# Altium integrated library LEMO Unipole And Multipole Type Connectors.IntLib: 1566 symbols (part 8 of 13)
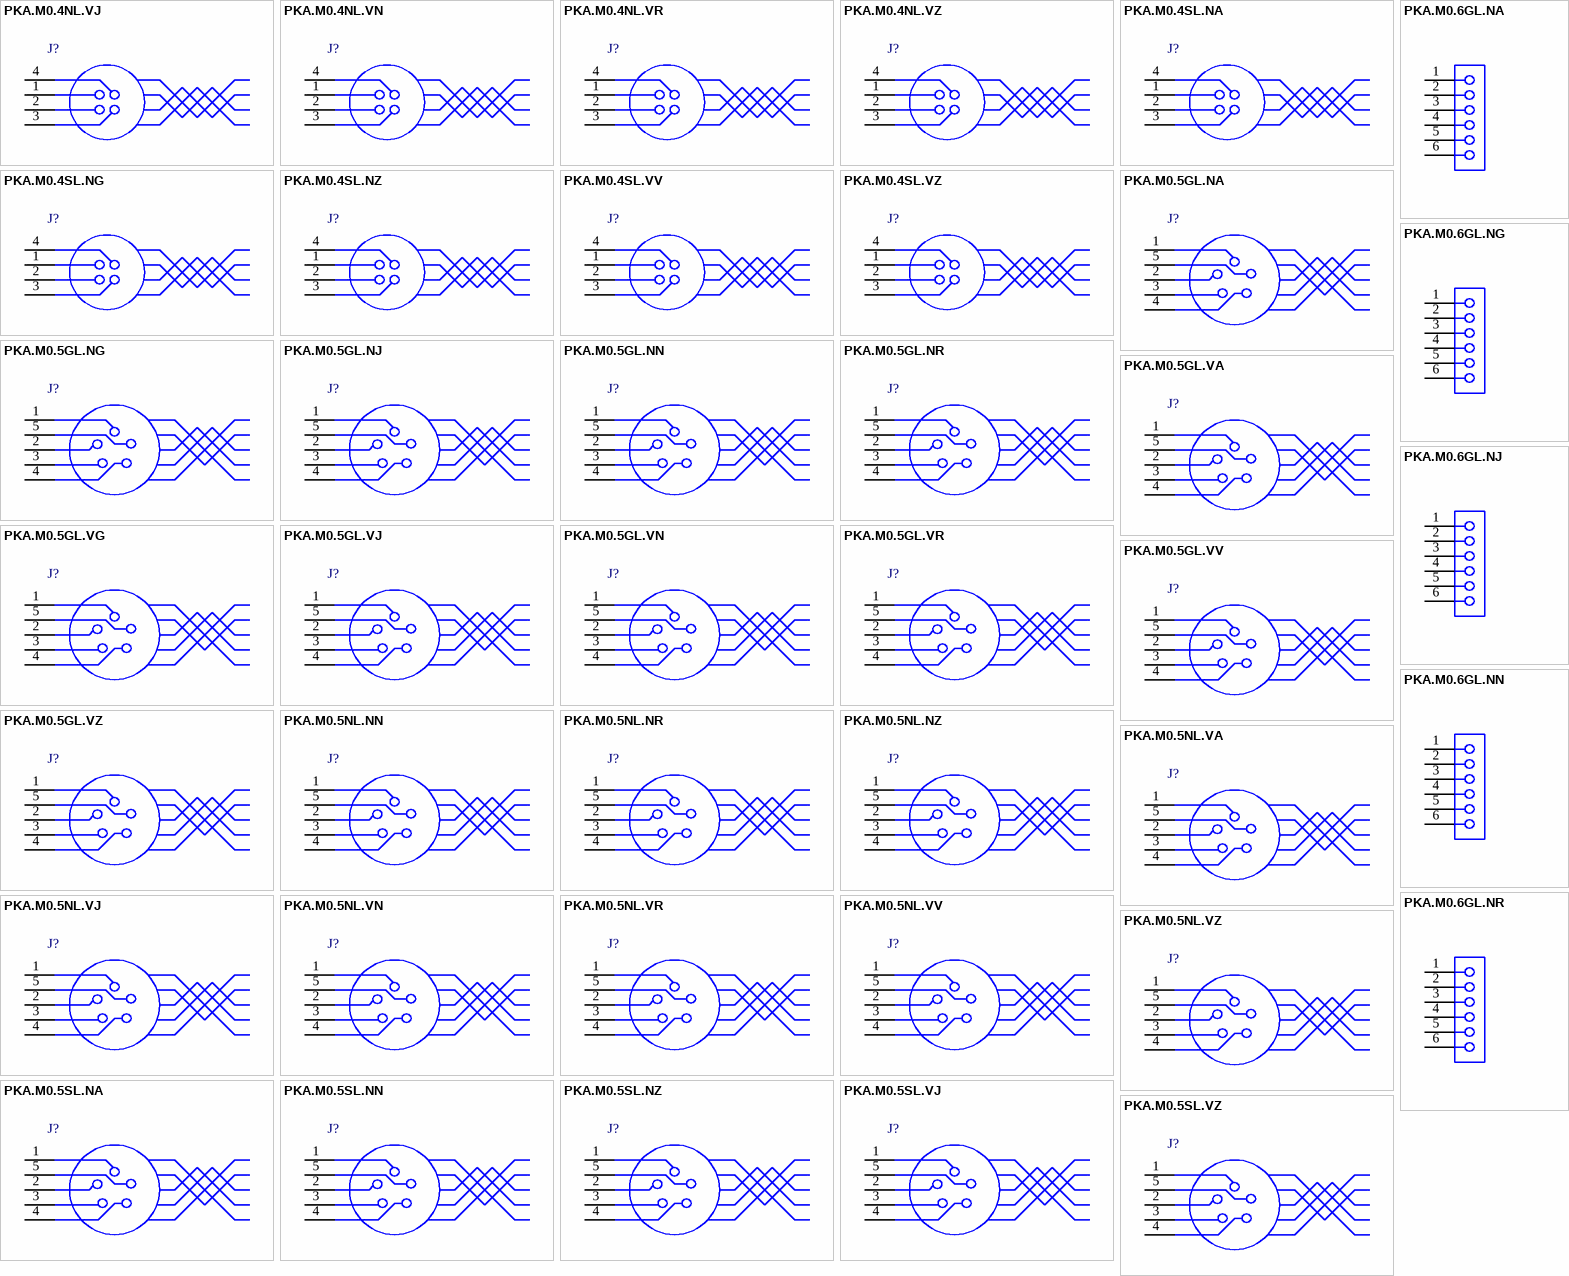
[diagram p50: symbols PKA.M0.4NL.VJ to PKA.M0.6GL.NR]

## PKA.M0.5NL.VN
designator J?
Fixed receptacle with two nuts (back panel mounting), 90° print contacts, Key (A), P series, Multipole Type with 5 Contacts; Manufacturer: LEMO; PartNumber: PKA.M0.5NL.VN; Number of contacts: 5; Contact Diameter: 0.9 mm; Test voltage (kV rms) Contact-Contact: 1.05; Rated Current(A): 7; DatasheetVersion: Jun-14; PackageReference: PKA.M0.5NL.VN; PackageDescription: Fixed receptacle with two nuts (back panel mounting), 90° print contacts, Key(A) for Printed Circuit; ComponentLink1Description: Manufacturer URL; ComponentLink1URL: http://www.lemo.com; ComponentLink2Description: Datasheet; ComponentLink2URL: http://intra.lemo.ch/catalog/ROW/UK_English/P_series_catalog.pdf
footprint PKA.M0.5NL.VN (Socket, Female, Height 33.5 mm, Through hole)
pins: 1, 2, 3, 4, 5

## PKA.M0.5NL.VR
designator J?
Fixed receptacle with two nuts (back panel mounting), 90° print contacts, Key (A), P series, Multipole Type with 5 Contacts; Manufacturer: LEMO; PartNumber: PKA.M0.5NL.VR; Number of contacts: 5; Contact Diameter: 0.9 mm; Test voltage (kV rms) Contact-Contact: 1.05; Rated Current(A): 7; DatasheetVersion: Jun-14; PackageReference: PKA.M0.5NL.VR; PackageDescription: Fixed receptacle with two nuts (back panel mounting), 90° print contacts, Key(A) for Printed Circuit; ComponentLink1Description: Manufacturer URL; ComponentLink1URL: http://www.lemo.com; ComponentLink2Description: Datasheet; ComponentLink2URL: http://intra.lemo.ch/catalog/ROW/UK_English/P_series_catalog.pdf
footprint PKA.M0.5NL.VR (Socket, Female, Height 33.5 mm, Through hole)
pins: 1, 2, 3, 4, 5

## PKA.M0.5NL.VV
designator J?
Fixed receptacle with two nuts (back panel mounting), 90° print contacts, Key (A), P series, Multipole Type with 5 Contacts; Manufacturer: LEMO; PartNumber: PKA.M0.5NL.VV; Number of contacts: 5; Contact Diameter: 0.9 mm; Test voltage (kV rms) Contact-Contact: 1.05; Rated Current(A): 7; DatasheetVersion: Jun-14; PackageReference: PKA.M0.5NL.VV; PackageDescription: Fixed receptacle with two nuts (back panel mounting), 90° print contacts, Key(A) for Printed Circuit; ComponentLink1Description: Manufacturer URL; ComponentLink1URL: http://www.lemo.com; ComponentLink2Description: Datasheet; ComponentLink2URL: http://intra.lemo.ch/catalog/ROW/UK_English/P_series_catalog.pdf
footprint PKA.M0.5NL.VV (Socket, Female, Height 33.5 mm, Through hole)
pins: 1, 2, 3, 4, 5

## PKA.M0.5NL.VZ
designator J?
Fixed receptacle with 1 nut (without 2nd front nut), Key (A), P series, Multipole Type with 5 Contacts; Manufacturer: LEMO; PartNumber: PKA.M0.5NL.VZ; Number of contacts: 5; Contact Diameter: 0.9 mm; Test voltage (kV rms) Contact-Contact: 1.05; Rated Current(A): 7; DatasheetVersion: Jun-14; PackageReference: PKA.M0.5NL.VZ; PackageDescription: Fixed receptacle with 1 nut (without 2nd front nut), Key(A) for Printed Circuit; ComponentLink1Description: Manufacturer URL; ComponentLink1URL: http://www.lemo.com; ComponentLink2Description: Datasheet; ComponentLink2URL: http://intra.lemo.ch/catalog/ROW/UK_English/P_series_catalog.pdf
footprint PKA.M0.5NL.VZ (Socket, Female, Height 33.5 mm, Through hole)
pins: 1, 2, 3, 4, 5

## PKA.M0.5SL.NA
designator J?
Fixed receptacle with two nuts (back panel mounting), straight print contacts, Key (A), P series, Multipole Type with 5 Contacts; Manufacturer: LEMO; PartNumber: PKA.M0.5SL.NA; Number of contacts: 5; Contact Diameter: 0.9 mm; Test voltage (kV rms) Contact-Contact: 1.05; Rated Current(A): 7; DatasheetVersion: Jun-14; PackageReference: PKA.M0.5SL.NA; PackageDescription: Fixed receptacle with two nuts (back panel mounting), straight print contacts, Key(A) for Printed Circuit; Supplier 1: Mouser; Supplier Part Number 1: 736-PKAM05SLNA; Supplier 2: Newark; Supplier Part Number 2: 99W2257; Supplier 3: Digi-Key; Supplier Part Number 3: PKA.M0.5SL.NA-ND; ComponentLink1Description: Manufacturer URL; ComponentLink1URL: http://www.lemo.com; ComponentLink2Description: Datasheet; ComponentLink2URL: http://intra.lemo.ch/catalog/ROW/UK_English/P_series_catalog.pdf
footprint PKA.M0.5SL.NA (Socket, Female, Height 33.5 mm, Through hole)
pins: 1, 2, 3, 4, 5

## PKA.M0.5SL.NN
designator J?
Fixed receptacle with two nuts (back panel mounting), straight print contacts, Key (A), P series, Multipole Type with 5 Contacts; Manufacturer: LEMO; PartNumber: PKA.M0.5SL.NN; Number of contacts: 5; Contact Diameter: 0.9 mm; Test voltage (kV rms) Contact-Contact: 1.05; Rated Current(A): 7; DatasheetVersion: Jun-14; PackageReference: PKA.M0.5SL.NN; PackageDescription: Fixed receptacle with two nuts (back panel mounting), straight print contacts, Key(A) for Printed Circuit; ComponentLink1Description: Manufacturer URL; ComponentLink1URL: http://www.lemo.com; ComponentLink2Description: Datasheet; ComponentLink2URL: http://intra.lemo.ch/catalog/ROW/UK_English/P_series_catalog.pdf
footprint PKA.M0.5SL.NN (Socket, Female, Height 33.5 mm, Through hole)
pins: 1, 2, 3, 4, 5

## PKA.M0.5SL.NZ
designator J?
Fixed receptacle with 1 nut (without 2nd front nut), Key (A), P series, Multipole Type with 5 Contacts; Manufacturer: LEMO; PartNumber: PKA.M0.5SL.NZ; Number of contacts: 5; Contact Diameter: 0.9 mm; Test voltage (kV rms) Contact-Contact: 1.05; Rated Current(A): 7; DatasheetVersion: Jun-14; PackageReference: PKA.M0.5SL.NZ; PackageDescription: Fixed receptacle with 1 nut (without 2nd front nut), Key(A) for Printed Circuit; Supplier 1: Mouser; Supplier Part Number 1: 736-PKAM05SLNZ; Supplier 2: Digi-Key; Supplier Part Number 2: PKA.M0.5SL.NZ-ND; ComponentLink1Description: Manufacturer URL; ComponentLink1URL: http://www.lemo.com; ComponentLink2Description: Datasheet; ComponentLink2URL: http://intra.lemo.ch/catalog/ROW/UK_English/P_series_catalog.pdf
footprint PKA.M0.5SL.NZ (Socket, Female, Height 25 mm, Through hole)
pins: 1, 2, 3, 4, 5

## PKA.M0.5SL.VJ
designator J?
Fixed receptacle with two nuts (back panel mounting), 90° print contacts, Key (A), P series, Multipole Type with 5 Contacts; Manufacturer: LEMO; PartNumber: PKA.M0.5SL.VJ; Number of contacts: 5; Contact Diameter: 0.9 mm; Test voltage (kV rms) Contact-Contact: 1.05; Rated Current(A): 7; DatasheetVersion: Jun-14; PackageReference: PKA.M0.5SL.VJ; PackageDescription: Fixed receptacle with two nuts (back panel mounting), 90° print contacts, Key(A) for Printed Circuit; ComponentLink1Description: Manufacturer URL; ComponentLink1URL: http://www.lemo.com; ComponentLink2Description: Datasheet; ComponentLink2URL: http://intra.lemo.ch/catalog/ROW/UK_English/P_series_catalog.pdf
footprint PKA.M0.5SL.VJ (Socket, Female, Height 33.5 mm, Through hole)
pins: 1, 2, 3, 4, 5

## PKA.M0.5SL.VZ
designator J?
Fixed receptacle with 1 nut (without 2nd front nut), Key (A), P series, Multipole Type with 5 Contacts; Manufacturer: LEMO; PartNumber: PKA.M0.5SL.VZ; Number of contacts: 5; Contact Diameter: 0.9 mm; Test voltage (kV rms) Contact-Contact: 1.05; Rated Current(A): 7; DatasheetVersion: Jun-14; PackageReference: PKA.M0.5SL.VZ; PackageDescription: Fixed receptacle with 1 nut (without 2nd front nut), Key(A) for Printed Circuit; Supplier 1: Mouser; Supplier Part Number 1: 736-PKAM05SLVZ; Supplier 2: Digi-Key; Supplier Part Number 2: PKA.M0.5SL.VZ-ND; ComponentLink1Description: Manufacturer URL; ComponentLink1URL: http://www.lemo.com; ComponentLink2Description: Datasheet; ComponentLink2URL: http://intra.lemo.ch/catalog/ROW/UK_English/P_series_catalog.pdf
footprint PKA.M0.5SL.VZ (Socket, Female, Height 33.5 mm, Through hole)
pins: 1, 2, 3, 4, 5

## PKA.M0.6GL.NA
designator J?
Fixed receptacle with two nuts (back panel mounting), straight print contacts, Key (A), P series, Multipole Type with 6 Contacts; Manufacturer: LEMO; PartNumber: PKA.M0.6GL.NA; Number of contacts: 6; Contact Diameter: 0.7 mm; Test voltage (kV rms) Contact-Contact: 1.05; DatasheetVersion: Jun-14; PackageReference: PKA.M0.6GL.NA; PackageDescription: Fixed receptacle with two nuts (back panel mounting), straight print contacts, Key(A) for Printed Circuit; Rated Current(A): 6; ComponentLink1Description: Manufacturer URL; ComponentLink1URL: http://www.lemo.com; ComponentLink2Description: Datasheet; ComponentLink2URL: http://intra.lemo.ch/catalog/ROW/UK_English/P_series_catalog.pdf
footprint PKA.M0.6GL.NA (Socket, Female, Height 33.5 mm, Through hole)
pins: 1, 2, 3, 4, 5, 6

## PKA.M0.6GL.NG
designator J?
Fixed receptacle with two nuts (back panel mounting), straight print contacts, Key (A), P series, Multipole Type with 6 Contacts; Manufacturer: LEMO; PartNumber: PKA.M0.6GL.NG; Number of contacts: 6; Contact Diameter: 0.7 mm; Test voltage (kV rms) Contact-Contact: 1.05; DatasheetVersion: Jun-14; PackageReference: PKA.M0.6GL.NG; PackageDescription: Fixed receptacle with two nuts (back panel mounting), straight print contacts, Key(A) for Printed Circuit; Rated Current(A): 6; ComponentLink1Description: Manufacturer URL; ComponentLink1URL: http://www.lemo.com; ComponentLink2Description: Datasheet; ComponentLink2URL: http://intra.lemo.ch/catalog/ROW/UK_English/P_series_catalog.pdf
footprint PKA.M0.6GL.NG (Socket, Female, Height 33.5 mm, Through hole)
pins: 1, 2, 3, 4, 5, 6

## PKA.M0.6GL.NJ
designator J?
Fixed receptacle with two nuts (back panel mounting), straight print contacts, Key (A), P series, Multipole Type with 6 Contacts; Manufacturer: LEMO; PartNumber: PKA.M0.6GL.NJ; Number of contacts: 6; Contact Diameter: 0.7 mm; Test voltage (kV rms) Contact-Contact: 1.05; DatasheetVersion: Jun-14; PackageReference: PKA.M0.6GL.NJ; PackageDescription: Fixed receptacle with two nuts (back panel mounting), straight print contacts, Key(A) for Printed Circuit; Rated Current(A): 6; ComponentLink1Description: Manufacturer URL; ComponentLink1URL: http://www.lemo.com; ComponentLink2Description: Datasheet; ComponentLink2URL: http://intra.lemo.ch/catalog/ROW/UK_English/P_series_catalog.pdf
footprint PKA.M0.6GL.NJ (Socket, Female, Height 33.5 mm, Through hole)
pins: 1, 2, 3, 4, 5, 6

## PKA.M0.6GL.NN
designator J?
Fixed receptacle with two nuts (back panel mounting), straight print contacts, Key (A), P series, Multipole Type with 6 Contacts; Manufacturer: LEMO; PartNumber: PKA.M0.6GL.NN; Number of contacts: 6; Contact Diameter: 0.7 mm; Test voltage (kV rms) Contact-Contact: 1.05; DatasheetVersion: Jun-14; PackageReference: PKA.M0.6GL.NN; PackageDescription: Fixed receptacle with two nuts (back panel mounting), straight print contacts, Key(A) for Printed Circuit; Rated Current(A): 6; ComponentLink1Description: Manufacturer URL; ComponentLink1URL: http://www.lemo.com; ComponentLink2Description: Datasheet; ComponentLink2URL: http://intra.lemo.ch/catalog/ROW/UK_English/P_series_catalog.pdf
footprint PKA.M0.6GL.NN (Socket, Female, Height 33.5 mm, Through hole)
pins: 1, 2, 3, 4, 5, 6

## PKA.M0.6GL.NR
designator J?
Fixed receptacle with two nuts (back panel mounting), straight print contacts, Key (A), P series, Multipole Type with 6 Contacts; Manufacturer: LEMO; PartNumber: PKA.M0.6GL.NR; Number of contacts: 6; Contact Diameter: 0.7 mm; Test voltage (kV rms) Contact-Contact: 1.05; DatasheetVersion: Jun-14; PackageReference: PKA.M0.6GL.NR; PackageDescription: Fixed receptacle with two nuts (back panel mounting), straight print contacts, Key(A) for Printed Circuit; Rated Current(A): 6; ComponentLink1Description: Manufacturer URL; ComponentLink1URL: http://www.lemo.com; ComponentLink2Description: Datasheet; ComponentLink2URL: http://intra.lemo.ch/catalog/ROW/UK_English/P_series_catalog.pdf
footprint PKA.M0.6GL.NR (Socket, Female, Height 33.5 mm, Through hole)
pins: 1, 2, 3, 4, 5, 6

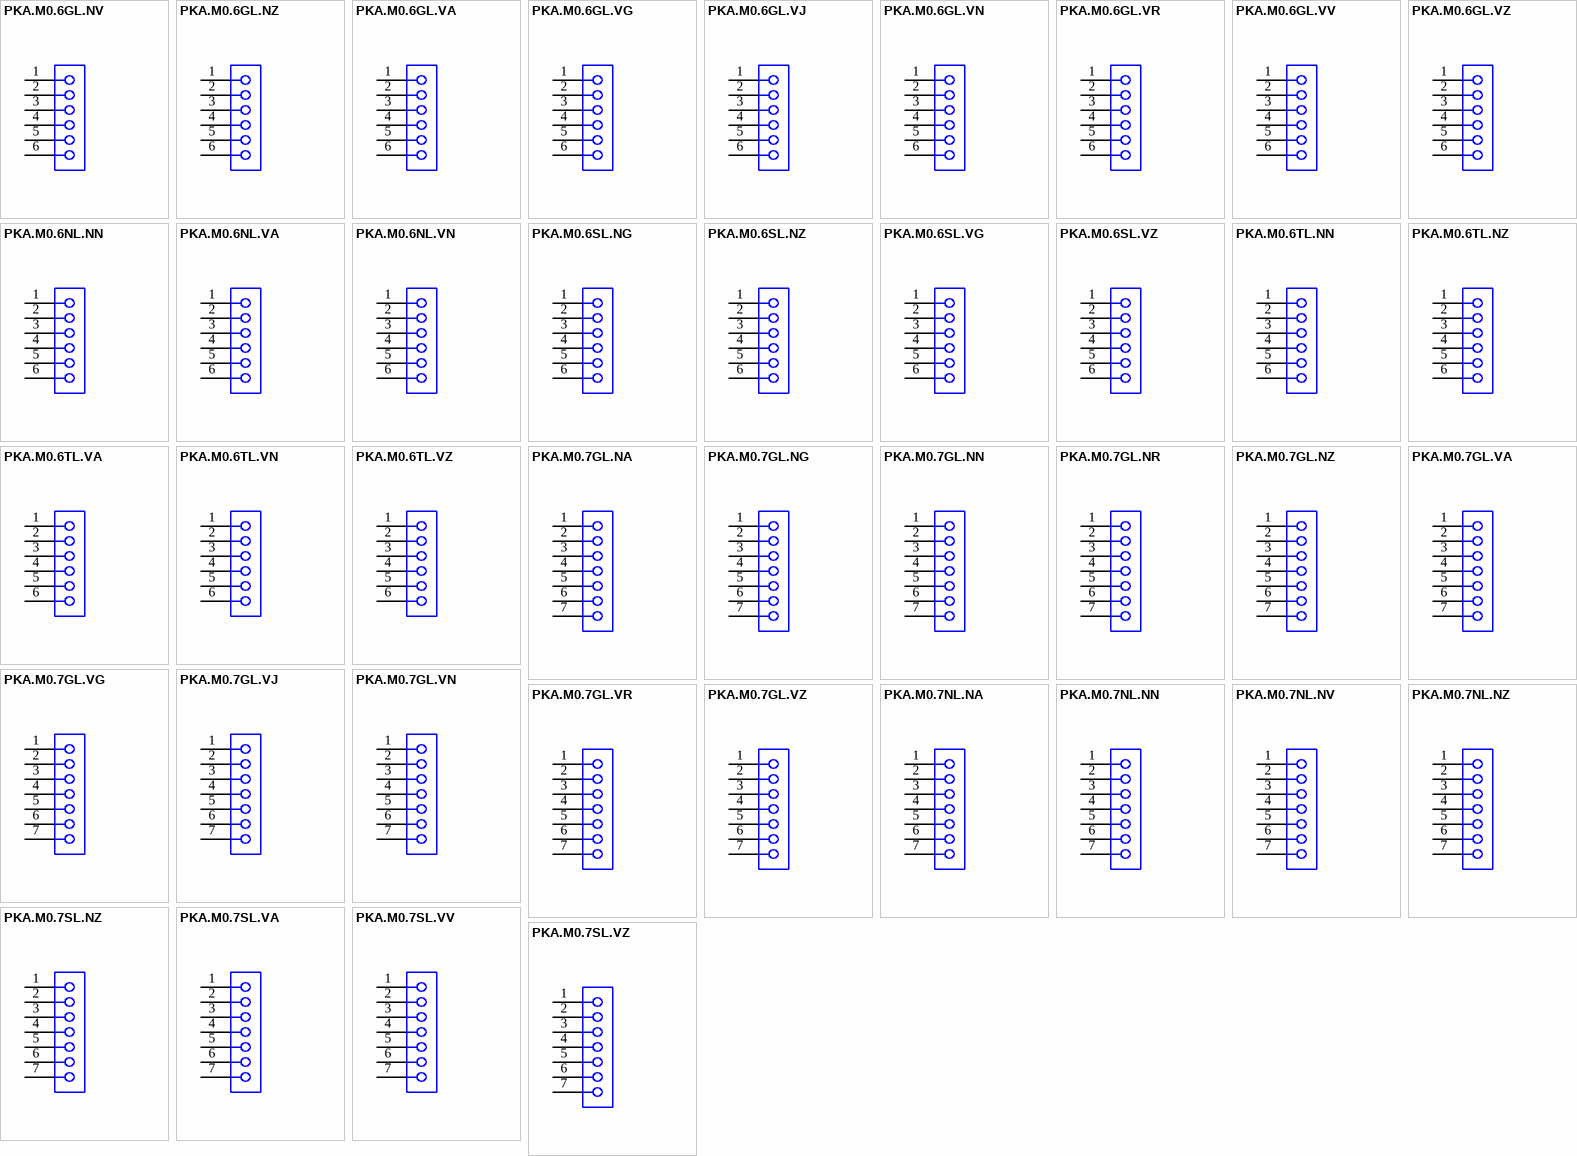
[diagram p25: symbols PKA.M0.6GL.NV to PKA.M0.7SL.VZ]

## PKA.M0.6GL.NV
designator J?
Fixed receptacle with two nuts (back panel mounting), straight print contacts, Key (A), P series, Multipole Type with 6 Contacts; Manufacturer: LEMO; PartNumber: PKA.M0.6GL.NV; Number of contacts: 6; Contact Diameter: 0.7 mm; Test voltage (kV rms) Contact-Contact: 1.05; DatasheetVersion: Jun-14; PackageReference: PKA.M0.6GL.NV; PackageDescription: Fixed receptacle with two nuts (back panel mounting), straight print contacts, Key(A) for Printed Circuit; Rated Current(A): 6; ComponentLink1Description: Manufacturer URL; ComponentLink1URL: http://www.lemo.com; ComponentLink2Description: Datasheet; ComponentLink2URL: http://intra.lemo.ch/catalog/ROW/UK_English/P_series_catalog.pdf
footprint PKA.M0.6GL.NV (Socket, Female, Height 33.5 mm, Through hole)
pins: 1, 2, 3, 4, 5, 6

## PKA.M0.6GL.NZ
designator J?
Fixed receptacle with 1 nut (without 2nd front nut), Key (A), P series, Multipole Type with 6 Contacts; Manufacturer: LEMO; PartNumber: PKA.M0.6GL.NZ; Number of contacts: 6; Contact Diameter: 0.7 mm; Test voltage (kV rms) Contact-Contact: 1.05; DatasheetVersion: Jun-14; PackageReference: PKA.M0.6GL.NZ; PackageDescription: Fixed receptacle with 1 nut (without 2nd front nut), Key(A) for Printed Circuit; Rated Current(A): 6; ComponentLink1Description: Manufacturer URL; ComponentLink1URL: http://www.lemo.com; ComponentLink2Description: Datasheet; ComponentLink2URL: http://intra.lemo.ch/catalog/ROW/UK_English/P_series_catalog.pdf
footprint PKA.M0.6GL.NZ (Socket, Female, Height 25 mm, Through hole)
pins: 1, 2, 3, 4, 5, 6

## PKA.M0.6GL.VA
designator J?
Fixed receptacle with two nuts (back panel mounting), 90° print contacts, Key (A), P series, Multipole Type with 6 Contacts; Manufacturer: LEMO; PartNumber: PKA.M0.6GL.VA; Number of contacts: 6; Contact Diameter: 0.7 mm; Test voltage (kV rms) Contact-Contact: 1.05; DatasheetVersion: Jun-14; PackageReference: PKA.M0.6GL.VA; PackageDescription: Fixed receptacle with two nuts (back panel mounting), 90° print contacts, Key(A) for Printed Circuit; Rated Current(A): 6; ComponentLink1Description: Manufacturer URL; ComponentLink1URL: http://www.lemo.com; ComponentLink2Description: Datasheet; ComponentLink2URL: http://intra.lemo.ch/catalog/ROW/UK_English/P_series_catalog.pdf
footprint PKA.M0.6GL.VA (Socket, Female, Height 33.5 mm, Through hole)
pins: 1, 2, 3, 4, 5, 6

## PKA.M0.6GL.VG
designator J?
Fixed receptacle with two nuts (back panel mounting), 90° print contacts, Key (A), P series, Multipole Type with 6 Contacts; Manufacturer: LEMO; PartNumber: PKA.M0.6GL.VG; Number of contacts: 6; Contact Diameter: 0.7 mm; Test voltage (kV rms) Contact-Contact: 1.05; DatasheetVersion: Jun-14; PackageReference: PKA.M0.6GL.VG; PackageDescription: Fixed receptacle with two nuts (back panel mounting), 90° print contacts, Key(A) for Printed Circuit; Rated Current(A): 6; ComponentLink1Description: Manufacturer URL; ComponentLink1URL: http://www.lemo.com; ComponentLink2Description: Datasheet; ComponentLink2URL: http://intra.lemo.ch/catalog/ROW/UK_English/P_series_catalog.pdf
footprint PKA.M0.6GL.VG (Socket, Female, Height 33.5 mm, Through hole)
pins: 1, 2, 3, 4, 5, 6

## PKA.M0.6GL.VJ
designator J?
Fixed receptacle with two nuts (back panel mounting), 90° print contacts, Key (A), P series, Multipole Type with 6 Contacts; Manufacturer: LEMO; PartNumber: PKA.M0.6GL.VJ; Number of contacts: 6; Contact Diameter: 0.7 mm; Test voltage (kV rms) Contact-Contact: 1.05; DatasheetVersion: Jun-14; PackageReference: PKA.M0.6GL.VJ; PackageDescription: Fixed receptacle with two nuts (back panel mounting), 90° print contacts, Key(A) for Printed Circuit; Rated Current(A): 6; ComponentLink1Description: Manufacturer URL; ComponentLink1URL: http://www.lemo.com; ComponentLink2Description: Datasheet; ComponentLink2URL: http://intra.lemo.ch/catalog/ROW/UK_English/P_series_catalog.pdf
footprint PKA.M0.6GL.VJ (Socket, Female, Height 33.5 mm, Through hole)
pins: 1, 2, 3, 4, 5, 6

## PKA.M0.6GL.VN
designator J?
Fixed receptacle with two nuts (back panel mounting), 90° print contacts, Key (A), P series, Multipole Type with 6 Contacts; Manufacturer: LEMO; PartNumber: PKA.M0.6GL.VN; Number of contacts: 6; Contact Diameter: 0.7 mm; Test voltage (kV rms) Contact-Contact: 1.05; DatasheetVersion: Jun-14; PackageReference: PKA.M0.6GL.VN; PackageDescription: Fixed receptacle with two nuts (back panel mounting), 90° print contacts, Key(A) for Printed Circuit; Rated Current(A): 6; ComponentLink1Description: Manufacturer URL; ComponentLink1URL: http://www.lemo.com; ComponentLink2Description: Datasheet; ComponentLink2URL: http://intra.lemo.ch/catalog/ROW/UK_English/P_series_catalog.pdf
footprint PKA.M0.6GL.VN (Socket, Female, Height 33.5 mm, Through hole)
pins: 1, 2, 3, 4, 5, 6

## PKA.M0.6GL.VR
designator J?
Fixed receptacle with two nuts (back panel mounting), 90° print contacts, Key (A), P series, Multipole Type with 6 Contacts; Manufacturer: LEMO; PartNumber: PKA.M0.6GL.VR; Number of contacts: 6; Contact Diameter: 0.7 mm; Test voltage (kV rms) Contact-Contact: 1.05; DatasheetVersion: Jun-14; PackageReference: PKA.M0.6GL.VR; PackageDescription: Fixed receptacle with two nuts (back panel mounting), 90° print contacts, Key(A) for Printed Circuit; Rated Current(A): 6; ComponentLink1Description: Manufacturer URL; ComponentLink1URL: http://www.lemo.com; ComponentLink2Description: Datasheet; ComponentLink2URL: http://intra.lemo.ch/catalog/ROW/UK_English/P_series_catalog.pdf
footprint PKA.M0.6GL.VR (Socket, Female, Height 33.5 mm, Through hole)
pins: 1, 2, 3, 4, 5, 6

## PKA.M0.6GL.VV
designator J?
Fixed receptacle with two nuts (back panel mounting), 90° print contacts, Key (A), P series, Multipole Type with 6 Contacts; Manufacturer: LEMO; PartNumber: PKA.M0.6GL.VV; Number of contacts: 6; Contact Diameter: 0.7 mm; Test voltage (kV rms) Contact-Contact: 1.05; DatasheetVersion: Jun-14; PackageReference: PKA.M0.6GL.VV; PackageDescription: Fixed receptacle with two nuts (back panel mounting), 90° print contacts, Key(A) for Printed Circuit; Rated Current(A): 6; ComponentLink1Description: Manufacturer URL; ComponentLink1URL: http://www.lemo.com; ComponentLink2Description: Datasheet; ComponentLink2URL: http://intra.lemo.ch/catalog/ROW/UK_English/P_series_catalog.pdf
footprint PKA.M0.6GL.VV (Socket, Female, Height 33.5 mm, Through hole)
pins: 1, 2, 3, 4, 5, 6

## PKA.M0.6GL.VZ
designator J?
Fixed receptacle with 1 nut (without 2nd front nut), Key (A), P series, Multipole Type with 6 Contacts; Manufacturer: LEMO; PartNumber: PKA.M0.6GL.VZ; Number of contacts: 6; Contact Diameter: 0.7 mm; Test voltage (kV rms) Contact-Contact: 1.05; DatasheetVersion: Jun-14; PackageReference: PKA.M0.6GL.VZ; PackageDescription: Fixed receptacle with 1 nut (without 2nd front nut), Key(A) for Printed Circuit; Rated Current(A): 6; ComponentLink1Description: Manufacturer URL; ComponentLink1URL: http://www.lemo.com; ComponentLink2Description: Datasheet; ComponentLink2URL: http://intra.lemo.ch/catalog/ROW/UK_English/P_series_catalog.pdf
footprint PKA.M0.6GL.VZ (Socket, Female, Height 33.5 mm, Through hole)
pins: 1, 2, 3, 4, 5, 6

## PKA.M0.6NL.NN
designator J?
Fixed receptacle with two nuts (back panel mounting), straight print contacts, Key (A), P series, Multipole Type with 6 Contacts; Manufacturer: LEMO; PartNumber: PKA.M0.6NL.NN; Number of contacts: 6; Contact Diameter: 0.7 mm; Test voltage (kV rms) Contact-Contact: 1.05; DatasheetVersion: Jun-14; PackageReference: PKA.M0.6NL.NN; PackageDescription: Fixed receptacle with two nuts (back panel mounting), straight print contacts, Key(A) for Printed Circuit; Rated Current(A): 6; ComponentLink1Description: Manufacturer URL; ComponentLink1URL: http://www.lemo.com; ComponentLink2Description: Datasheet; ComponentLink2URL: http://intra.lemo.ch/catalog/ROW/UK_English/P_series_catalog.pdf
footprint PKA.M0.6NL.NN (Socket, Female, Height 33.5 mm, Through hole)
pins: 1, 2, 3, 4, 5, 6

## PKA.M0.6NL.VA
designator J?
Fixed receptacle with two nuts (back panel mounting), 90° print contacts, Key (A), P series, Multipole Type with 6 Contacts; Manufacturer: LEMO; PartNumber: PKA.M0.6NL.VA; Number of contacts: 6; Contact Diameter: 0.7 mm; Test voltage (kV rms) Contact-Contact: 1.05; DatasheetVersion: Jun-14; PackageReference: PKA.M0.6NL.VA; PackageDescription: Fixed receptacle with two nuts (back panel mounting), 90° print contacts, Key(A) for Printed Circuit; Rated Current(A): 6; ComponentLink1Description: Manufacturer URL; ComponentLink1URL: http://www.lemo.com; ComponentLink2Description: Datasheet; ComponentLink2URL: http://intra.lemo.ch/catalog/ROW/UK_English/P_series_catalog.pdf
footprint PKA.M0.6NL.VA (Socket, Female, Height 33.5 mm, Through hole)
pins: 1, 2, 3, 4, 5, 6

## PKA.M0.6NL.VN
designator J?
Fixed receptacle with two nuts (back panel mounting), 90° print contacts, Key (A), P series, Multipole Type with 6 Contacts; Manufacturer: LEMO; PartNumber: PKA.M0.6NL.VN; Number of contacts: 6; Contact Diameter: 0.7 mm; Test voltage (kV rms) Contact-Contact: 1.05; DatasheetVersion: Jun-14; PackageReference: PKA.M0.6NL.VN; PackageDescription: Fixed receptacle with two nuts (back panel mounting), 90° print contacts, Key(A) for Printed Circuit; Rated Current(A): 6; ComponentLink1Description: Manufacturer URL; ComponentLink1URL: http://www.lemo.com; ComponentLink2Description: Datasheet; ComponentLink2URL: http://intra.lemo.ch/catalog/ROW/UK_English/P_series_catalog.pdf
footprint PKA.M0.6NL.VN (Socket, Female, Height 33.5 mm, Through hole)
pins: 1, 2, 3, 4, 5, 6

## PKA.M0.6SL.NG
designator J?
Fixed receptacle with two nuts (back panel mounting), straight print contacts, Key (A),  series, Multipole Type with 6 Contacts; Manufacturer: LEMO; PartNumber: PKA.M0.6SL.NG; Number of contacts: 6; Contact Diameter: 0.7 mm; Test voltage (kV rms) Contact-Contact: 1.05; DatasheetVersion: Jun-14; PackageReference: PKA.M0.6SL.NG; PackageDescription: Fixed receptacle with two nuts (back panel mounting), straight print contacts, Key(A) for Printed Circuit; Supplier 1: Mouser; Supplier Part Number 1: 736-PKAM06SLNG; Supplier 2: Digi-Key; Supplier Part Number 2: PKA.M0.6SL.NG-ND; Rated Current(A): 6; ComponentLink1Description: Manufacturer URL; ComponentLink1URL: http://www.lemo.com; ComponentLink2Description: Datasheet; ComponentLink2URL: http://intra.lemo.ch/catalog/ROW/UK_English/P_series_catalog.pdf
footprint PKA.M0.6SL.NG (Socket, Female, Height 33.5 mm, Through hole)
pins: 1, 2, 3, 4, 5, 6

## PKA.M0.6SL.NZ
designator J?
Fixed receptacle with 1 nut (without 2nd front nut), Key (A), P series, Multipole Type with 6 Contacts; Manufacturer: LEMO; PartNumber: PKA.M0.6SL.NZ; Number of contacts: 6; Contact Diameter: 0.7 mm; Test voltage (kV rms) Contact-Contact: 1.05; DatasheetVersion: Jun-14; PackageReference: PKA.M0.6SL.NZ; PackageDescription: Fixed receptacle with 1 nut (without 2nd front nut), Key(A) for Printed Circuit; Supplier 1: Mouser; Supplier Part Number 1: 736-PKAM06SLNZ; Supplier 2: Digi-Key; Supplier Part Number 2: PKA.M0.6SL.NZ-ND; Rated Current(A): 6; ComponentLink1Description: Manufacturer URL; ComponentLink1URL: http://www.lemo.com; ComponentLink2Description: Datasheet; ComponentLink2URL: http://intra.lemo.ch/catalog/ROW/UK_English/P_series_catalog.pdf
footprint PKA.M0.6SL.NZ (Socket, Female, Height 25 mm, Through hole)
pins: 1, 2, 3, 4, 5, 6

## PKA.M0.6SL.VG
designator J?
Fixed receptacle with two nuts (back panel mounting), 90° print contacts, Key (A), P series, Multipole Type with 6 Contacts; Manufacturer: LEMO; PartNumber: PKA.M0.6SL.VG; Number of contacts: 6; Contact Diameter: 0.7 mm; Test voltage (kV rms) Contact-Contact: 1.05; DatasheetVersion: Jun-14; PackageReference: PKA.M0.6SL.VG; PackageDescription: Fixed receptacle with two nuts (back panel mounting), 90° print contacts, Key(A) for Printed Circuit; Rated Current(A): 6; ComponentLink1Description: Manufacturer URL; ComponentLink1URL: http://www.lemo.com; ComponentLink2Description: Datasheet; ComponentLink2URL: http://intra.lemo.ch/catalog/ROW/UK_English/P_series_catalog.pdf
footprint PKA.M0.6SL.VG (Socket, Female, Height 33.5 mm, Through hole)
pins: 1, 2, 3, 4, 5, 6

## PKA.M0.6SL.VZ
designator J?
Fixed receptacle with 1 nut (without 2nd front nut), Key (A), P series, Multipole Type with 6 Contacts; Manufacturer: LEMO; PartNumber: PKA.M0.6SL.VZ; Number of contacts: 6; Contact Diameter: 0.7 mm; Test voltage (kV rms) Contact-Contact: 1.05; DatasheetVersion: Jun-14; PackageReference: PKA.M0.6SL.VZ; PackageDescription: Fixed receptacle with 1 nut (without 2nd front nut), Key(A) for Printed Circuit; Supplier 1: Mouser; Supplier Part Number 1: 736-PKAM06SLVZ; Supplier 2: Digi-Key; Supplier Part Number 2: PKA.M0.6SL.VZ-ND; Rated Current(A): 6; ComponentLink1Description: Manufacturer URL; ComponentLink1URL: http://www.lemo.com; ComponentLink2Description: Datasheet; ComponentLink2URL: http://intra.lemo.ch/catalog/ROW/UK_English/P_series_catalog.pdf
footprint PKA.M0.6SL.VZ (Socket, Female, Height 33.5 mm, Through hole)
pins: 1, 2, 3, 4, 5, 6

## PKA.M0.6TL.NN
designator J?
Fixed receptacle with two nuts (back panel mounting), straight print contacts, Key (A), P series, Multipole Type with 6 Contacts; Manufacturer: LEMO; PartNumber: PKA.M0.6TL.NN; Number of contacts: 6; Contact Diameter: 0.7 mm; Test voltage (kV rms) Contact-Contact: 1.05; DatasheetVersion: Jun-14; PackageReference: PKA.M0.6TL.NN; PackageDescription: Fixed receptacle with two nuts (back panel mounting), straight print contacts, Key(A) for Printed Circuit; Supplier 1: Mouser; Supplier Part Number 1: 736-PKAM06TLNN; Supplier 2: Digi-Key; Supplier Part Number 2: PKA.M0.6TL.NN-ND; Rated Current(A): 6; ComponentLink1Description: Manufacturer URL; ComponentLink1URL: http://www.lemo.com; ComponentLink2Description: Datasheet; ComponentLink2URL: http://intra.lemo.ch/catalog/ROW/UK_English/P_series_catalog.pdf
footprint PKA.M0.6TL.NN (Socket, Female, Height 33.5 mm, Through hole)
pins: 1, 2, 3, 4, 5, 6

## PKA.M0.6TL.NZ
designator J?
Fixed receptacle with 1 nut (without 2nd front nut), Key (A), P series, Multipole Type with 6 Contacts; Manufacturer: LEMO; PartNumber: PKA.M0.6TL.NZ; Number of contacts: 6; Contact Diameter: 0.7 mm; Test voltage (kV rms) Contact-Contact: 1.05; DatasheetVersion: Jun-14; PackageReference: PKA.M0.6TL.NZ; PackageDescription: Fixed receptacle with 1 nut (without 2nd front nut), Key(A) for Printed Circuit; Supplier 1: Mouser; Supplier Part Number 1: 736-PKAM06TLNZ; Supplier 2: Digi-Key; Supplier Part Number 2: PKA.M0.6TL.NZ-ND; Rated Current(A): 6; ComponentLink1Description: Manufacturer URL; ComponentLink1URL: http://www.lemo.com; ComponentLink2Description: Datasheet; ComponentLink2URL: http://intra.lemo.ch/catalog/ROW/UK_English/P_series_catalog.pdf
footprint PKA.M0.6TL.NZ (Socket, Female, Height 25 mm, Through hole)
pins: 1, 2, 3, 4, 5, 6

## PKA.M0.6TL.VA
designator J?
Fixed receptacle with two nuts (back panel mounting), 90° print contacts, Key (A), P series, Multipole Type with 6 Contacts; Manufacturer: LEMO; PartNumber: PKA.M0.6TL.VA; Number of contacts: 6; Contact Diameter: 0.7 mm; Test voltage (kV rms) Contact-Contact: 1.05; DatasheetVersion: Jun-14; PackageReference: PKA.M0.6TL.VA; PackageDescription: Fixed receptacle with two nuts (back panel mounting), 90° print contacts, Key(A) for Printed Circuit; Supplier 1: Mouser; Supplier Part Number 1: 736-PKAM06TLVA; Supplier 2: Digi-Key; Supplier Part Number 2: PKA.M0.6TL.VA-ND; Rated Current(A): 6; ComponentLink1Description: Manufacturer URL; ComponentLink1URL: http://www.lemo.com; ComponentLink2Description: Datasheet; ComponentLink2URL: http://intra.lemo.ch/catalog/ROW/UK_English/P_series_catalog.pdf
footprint PKA.M0.6TL.VA (Socket, Female, Height 33.5 mm, Through hole)
pins: 1, 2, 3, 4, 5, 6

## PKA.M0.6TL.VN
designator J?
Fixed receptacle with two nuts (back panel mounting), 90° print contacts, Key (A), P series, Multipole Type with 6 Contacts; Manufacturer: LEMO; PartNumber: PKA.M0.6TL.VN; Number of contacts: 6; Contact Diameter: 0.7 mm; Test voltage (kV rms) Contact-Contact: 1.05; DatasheetVersion: Jun-14; PackageReference: PKA.M0.6TL.VN; PackageDescription: Fixed receptacle with two nuts (back panel mounting), 90° print contacts, Key(A) for Printed Circuit; Supplier 1: Mouser; Supplier Part Number 1: 736-PKAM06TLVN; Supplier 2: Digi-Key; Supplier Part Number 2: PKA.M0.6TL.VN-ND; Rated Current(A): 6; ComponentLink1Description: Manufacturer URL; ComponentLink1URL: http://www.lemo.com; ComponentLink2Description: Datasheet; ComponentLink2URL: http://intra.lemo.ch/catalog/ROW/UK_English/P_series_catalog.pdf
footprint PKA.M0.6TL.VN (Socket, Female, Height 33.5 mm, Through hole)
pins: 1, 2, 3, 4, 5, 6

## PKA.M0.6TL.VZ
designator J?
Fixed receptacle with 1 nut (without 2nd front nut), Key (A), P series, Multipole Type with 6 Contacts; Manufacturer: LEMO; PartNumber: PKA.M0.6TL.VZ; Number of contacts: 6; Contact Diameter: 0.7 mm; Test voltage (kV rms) Contact-Contact: 1.05; DatasheetVersion: Jun-14; PackageReference: PKA.M0.6TL.VZ; PackageDescription: Fixed receptacle with 1 nut (without 2nd front nut), Key(A) for Printed Circuit; Supplier 1: Mouser; Supplier Part Number 1: 736-PKAM06TLVZ; Supplier 2: Digi-Key; Supplier Part Number 2: PKA.M0.6TL.VZ-ND; Rated Current(A): 6; ComponentLink1Description: Manufacturer URL; ComponentLink1URL: http://www.lemo.com; ComponentLink2Description: Datasheet; ComponentLink2URL: http://intra.lemo.ch/catalog/ROW/UK_English/P_series_catalog.pdf
footprint PKA.M0.6TL.VZ (Socket, Female, Height 33.5 mm, Through hole)
pins: 1, 2, 3, 4, 5, 6

## PKA.M0.7GL.NA
designator J?
Fixed receptacle with two nuts (back panel mounting), straight print contacts, Key (A), P series, Multipole Type with 7 Contacts; Manufacturer: LEMO; PartNumber: PKA.M0.7GL.NA; Number of contacts: 7; Contact Diameter: 0.7 mm; Test voltage (kV rms) Contact-Contact: 1.05; Rated Current(A): 5; DatasheetVersion: Jun-14; PackageReference: PKA.M0.7GL.NA; PackageDescription: Fixed receptacle with two nuts (back panel mounting), straight print contacts, Key(A) for Printed Circuit; ComponentLink1Description: Manufacturer URL; ComponentLink1URL: http://www.lemo.com; ComponentLink2Description: Datasheet; ComponentLink2URL: http://intra.lemo.ch/catalog/ROW/UK_English/P_series_catalog.pdf
footprint PKA.M0.7GL.NA (Socket, Female, Height 33.5 mm, Through hole)
pins: 1, 2, 3, 4, 5, 6, 7

## PKA.M0.7GL.NG
designator J?
Fixed receptacle with two nuts (back panel mounting), straight print contacts, Key (A),  series, Multipole Type with 7 Contacts; Manufacturer: LEMO; PartNumber: PKA.M0.7GL.NG; Number of contacts: 7; Contact Diameter: 0.7 mm; Test voltage (kV rms) Contact-Contact: 1.05; Rated Current(A): 5; DatasheetVersion: Jun-14; PackageReference: PKA.M0.7GL.NG; PackageDescription: Fixed receptacle with two nuts (back panel mounting), straight print contacts, Key(A) for Printed Circuit; ComponentLink1Description: Manufacturer URL; ComponentLink1URL: http://www.lemo.com; ComponentLink2Description: Datasheet; ComponentLink2URL: http://intra.lemo.ch/catalog/ROW/UK_English/P_series_catalog.pdf
footprint PKA.M0.7GL.NG (Socket, Female, Height 33.5 mm, Through hole)
pins: 1, 2, 3, 4, 5, 6, 7

## PKA.M0.7GL.NN
designator J?
Fixed receptacle with two nuts (back panel mounting), straight print contacts, Key (A), P series, Multipole Type with 7 Contacts; Manufacturer: LEMO; PartNumber: PKA.M0.7GL.NN; Number of contacts: 7; Contact Diameter: 0.7 mm; Test voltage (kV rms) Contact-Contact: 1.05; Rated Current(A): 5; DatasheetVersion: Jun-14; PackageReference: PKA.M0.7GL.NN; PackageDescription: Fixed receptacle with two nuts (back panel mounting), straight print contacts, Key(A) for Printed Circuit; ComponentLink1Description: Manufacturer URL; ComponentLink1URL: http://www.lemo.com; ComponentLink2Description: Datasheet; ComponentLink2URL: http://intra.lemo.ch/catalog/ROW/UK_English/P_series_catalog.pdf
footprint PKA.M0.7GL.NN (Socket, Female, Height 33.5 mm, Through hole)
pins: 1, 2, 3, 4, 5, 6, 7

## PKA.M0.7GL.NR
designator J?
Fixed receptacle with two nuts (back panel mounting), straight print contacts, Key (A), P series, Multipole Type with 7 Contacts; Manufacturer: LEMO; PartNumber: PKA.M0.7GL.NR; Number of contacts: 7; Contact Diameter: 0.7 mm; Test voltage (kV rms) Contact-Contact: 1.05; Rated Current(A): 5; DatasheetVersion: Jun-14; PackageReference: PKA.M0.7GL.NR; PackageDescription: Fixed receptacle with two nuts (back panel mounting), straight print contacts, Key(A) for Printed Circuit; ComponentLink1Description: Manufacturer URL; ComponentLink1URL: http://www.lemo.com; ComponentLink2Description: Datasheet; ComponentLink2URL: http://intra.lemo.ch/catalog/ROW/UK_English/P_series_catalog.pdf
footprint PKA.M0.7GL.NR (Socket, Female, Height 33.5 mm, Through hole)
pins: 1, 2, 3, 4, 5, 6, 7

## PKA.M0.7GL.NZ
designator J?
Fixed receptacle with 1 nut (without 2nd front nut), Key (A), P series, Multipole Type with 7 Contacts; Manufacturer: LEMO; PartNumber: PKA.M0.7GL.NZ; Number of contacts: 7; Contact Diameter: 0.7 mm; Test voltage (kV rms) Contact-Contact: 1.05; Rated Current(A): 5; DatasheetVersion: Jun-14; PackageReference: PKA.M0.7GL.NZ; PackageDescription: Fixed receptacle with 1 nut (without 2nd front nut), Key(A) for Printed Circuit; ComponentLink1Description: Manufacturer URL; ComponentLink1URL: http://www.lemo.com; ComponentLink2Description: Datasheet; ComponentLink2URL: http://intra.lemo.ch/catalog/ROW/UK_English/P_series_catalog.pdf
footprint PKA.M0.7GL.NZ (Socket, Female, Height 25 mm, Through hole)
pins: 1, 2, 3, 4, 5, 6, 7

## PKA.M0.7GL.VA
designator J?
Fixed receptacle with two nuts (back panel mounting), 90° print contacts, Key (A), P series, Multipole Type with 7 Contacts; Manufacturer: LEMO; PartNumber: PKA.M0.7GL.VA; Number of contacts: 7; Contact Diameter: 0.7 mm; Test voltage (kV rms) Contact-Contact: 1.05; Rated Current(A): 5; DatasheetVersion: Jun-14; PackageReference: PKA.M0.7GL.VA; PackageDescription: Fixed receptacle with two nuts (back panel mounting), 90° print contacts, Key(A) for Printed Circuit; Supplier 1: Mouser; Supplier Part Number 1: 736-PKAM07GLVA; Supplier 2: Digi-Key; Supplier Part Number 2: PKA.M0.7GL.VA-ND; ComponentLink1Description: Manufacturer URL; ComponentLink1URL: http://www.lemo.com; ComponentLink2Description: Datasheet; ComponentLink2URL: http://intra.lemo.ch/catalog/ROW/UK_English/P_series_catalog.pdf
footprint PKA.M0.7GL.VA (Socket, Female, Height 33.5 mm, Through hole)
pins: 1, 2, 3, 4, 5, 6, 7

## PKA.M0.7GL.VG
designator J?
Fixed receptacle with two nuts (back panel mounting), 90° print contacts, Key (A),  series, Multipole Type with 7 Contacts; Manufacturer: LEMO; PartNumber: PKA.M0.7GL.VG; Number of contacts: 7; Contact Diameter: 0.7 mm; Test voltage (kV rms) Contact-Contact: 1.05; Rated Current(A): 5; DatasheetVersion: Jun-14; PackageReference: PKA.M0.7GL.VG; PackageDescription: Fixed receptacle with two nuts (back panel mounting), 90° print contacts, Key(A) for Printed Circuit; ComponentLink1Description: Manufacturer URL; ComponentLink1URL: http://www.lemo.com; ComponentLink2Description: Datasheet; ComponentLink2URL: http://intra.lemo.ch/catalog/ROW/UK_English/P_series_catalog.pdf
footprint PKA.M0.7GL.VG (Socket, Female, Height 33.5 mm, Through hole)
pins: 1, 2, 3, 4, 5, 6, 7

## PKA.M0.7GL.VJ
designator J?
Fixed receptacle with two nuts (back panel mounting), 90° print contacts, Key (A), P series, Multipole Type with 7 Contacts; Manufacturer: LEMO; PartNumber: PKA.M0.7GL.VJ; Number of contacts: 7; Contact Diameter: 0.7 mm; Test voltage (kV rms) Contact-Contact: 1.05; Rated Current(A): 5; DatasheetVersion: Jun-14; PackageReference: PKA.M0.7GL.VJ; PackageDescription: Fixed receptacle with two nuts (back panel mounting), 90° print contacts, Key(A) for Printed Circuit; ComponentLink1Description: Manufacturer URL; ComponentLink1URL: http://www.lemo.com; ComponentLink2Description: Datasheet; ComponentLink2URL: http://intra.lemo.ch/catalog/ROW/UK_English/P_series_catalog.pdf
footprint PKA.M0.7GL.VJ (Socket, Female, Height 33.5 mm, Through hole)
pins: 1, 2, 3, 4, 5, 6, 7

## PKA.M0.7GL.VN
designator J?
Fixed receptacle with two nuts (back panel mounting), 90° print contacts, Key (A), P series, Multipole Type with 7 Contacts; Manufacturer: LEMO; PartNumber: PKA.M0.7GL.VN; Number of contacts: 7; Contact Diameter: 0.7 mm; Test voltage (kV rms) Contact-Contact: 1.05; Rated Current(A): 5; DatasheetVersion: Jun-14; PackageReference: PKA.M0.7GL.VN; PackageDescription: Fixed receptacle with two nuts (back panel mounting), 90° print contacts, Key(A) for Printed Circuit; ComponentLink1Description: Manufacturer URL; ComponentLink1URL: http://www.lemo.com; ComponentLink2Description: Datasheet; ComponentLink2URL: http://intra.lemo.ch/catalog/ROW/UK_English/P_series_catalog.pdf
footprint PKA.M0.7GL.VN (Socket, Female, Height 33.5 mm, Through hole)
pins: 1, 2, 3, 4, 5, 6, 7

## PKA.M0.7GL.VR
designator J?
Fixed receptacle with two nuts (back panel mounting), 90° print contacts, Key (A), P series, Multipole Type with 7 Contacts; Manufacturer: LEMO; PartNumber: PKA.M0.7GL.VR; Number of contacts: 7; Contact Diameter: 0.7 mm; Test voltage (kV rms) Contact-Contact: 1.05; Rated Current(A): 5; DatasheetVersion: Jun-14; PackageReference: PKA.M0.7GL.VR; PackageDescription: Fixed receptacle with two nuts (back panel mounting), 90° print contacts, Key(A) for Printed Circuit; ComponentLink1Description: Manufacturer URL; ComponentLink1URL: http://www.lemo.com; ComponentLink2Description: Datasheet; ComponentLink2URL: http://intra.lemo.ch/catalog/ROW/UK_English/P_series_catalog.pdf
footprint PKA.M0.7GL.VR (Socket, Female, Height 33.5 mm, Through hole)
pins: 1, 2, 3, 4, 5, 6, 7

## PKA.M0.7GL.VZ
designator J?
Fixed receptacle with 1 nut (without 2nd front nut), Key (A), P series, Multipole Type with 7 Contacts; Manufacturer: LEMO; PartNumber: PKA.M0.7GL.VZ; Number of contacts: 7; Contact Diameter: 0.7 mm; Test voltage (kV rms) Contact-Contact: 1.05; Rated Current(A): 5; DatasheetVersion: Jun-14; PackageReference: PKA.M0.7GL.VZ; PackageDescription: Fixed receptacle with 1 nut (without 2nd front nut), Key(A) for Printed Circuit; ComponentLink1Description: Manufacturer URL; ComponentLink1URL: http://www.lemo.com; ComponentLink2Description: Datasheet; ComponentLink2URL: http://intra.lemo.ch/catalog/ROW/UK_English/P_series_catalog.pdf
footprint PKA.M0.7GL.VZ (Socket, Female, Height 33.5 mm, Through hole)
pins: 1, 2, 3, 4, 5, 6, 7

## PKA.M0.7NL.NA
designator J?
Fixed receptacle with two nuts (back panel mounting), straight print contacts, Key (A), P series, Multipole Type with 7 Contacts; Manufacturer: LEMO; PartNumber: PKA.M0.7NL.NA; Number of contacts: 7; Contact Diameter: 0.7 mm; Test voltage (kV rms) Contact-Contact: 1.05; Rated Current(A): 5; DatasheetVersion: Jun-14; PackageReference: PKA.M0.7NL.NA; PackageDescription: Fixed receptacle with two nuts (back panel mounting), straight print contacts, Key(A) for Printed Circuit; ComponentLink1Description: Manufacturer URL; ComponentLink1URL: http://www.lemo.com; ComponentLink2Description: Datasheet; ComponentLink2URL: http://intra.lemo.ch/catalog/ROW/UK_English/P_series_catalog.pdf
footprint PKA.M0.7NL.NA (Socket, Female, Height 33.5 mm, Through hole)
pins: 1, 2, 3, 4, 5, 6, 7

## PKA.M0.7NL.NN
designator J?
Fixed receptacle with two nuts (back panel mounting), straight print contacts, Key (A),  series, Multipole Type with 7 Contacts; Manufacturer: LEMO; PartNumber: PKA.M0.7NL.NN; Number of contacts: 7; Contact Diameter: 0.7 mm; Test voltage (kV rms) Contact-Contact: 1.05; Rated Current(A): 5; DatasheetVersion: Jun-14; PackageReference: PKA.M0.7NL.NN; PackageDescription: Fixed receptacle with two nuts (back panel mounting), straight print contacts, Key(A) for Printed Circuit; ComponentLink1Description: Manufacturer URL; ComponentLink1URL: http://www.lemo.com; ComponentLink2Description: Datasheet; ComponentLink2URL: http://intra.lemo.ch/catalog/ROW/UK_English/P_series_catalog.pdf
footprint PKA.M0.7NL.NN (Socket, Female, Height 33.5 mm, Through hole)
pins: 1, 2, 3, 4, 5, 6, 7

## PKA.M0.7NL.NV
designator J?
Fixed receptacle with two nuts (back panel mounting), straight print contacts, Key (A), P series, Multipole Type with 7 Contacts; Manufacturer: LEMO; PartNumber: PKA.M0.7NL.NV; Number of contacts: 7; Contact Diameter: 0.7 mm; Test voltage (kV rms) Contact-Contact: 1.05; Rated Current(A): 5; DatasheetVersion: Jun-14; PackageReference: PKA.M0.7NL.NV; PackageDescription: Fixed receptacle with two nuts (back panel mounting), straight print contacts, Key(A) for Printed Circuit; ComponentLink1Description: Manufacturer URL; ComponentLink1URL: http://www.lemo.com; ComponentLink2Description: Datasheet; ComponentLink2URL: http://intra.lemo.ch/catalog/ROW/UK_English/P_series_catalog.pdf
footprint PKA.M0.7NL.NV (Socket, Female, Height 33.5 mm, Through hole)
pins: 1, 2, 3, 4, 5, 6, 7

## PKA.M0.7NL.NZ
designator J?
Fixed receptacle with 1 nut (without 2nd front nut), Key (A), P series, Multipole Type with 7 Contacts; Manufacturer: LEMO; PartNumber: PKA.M0.7NL.NZ; Number of contacts: 7; Contact Diameter: 0.7 mm; Test voltage (kV rms) Contact-Contact: 1.05; Rated Current(A): 5; DatasheetVersion: Jun-14; PackageReference: PKA.M0.7NL.NZ; PackageDescription: Fixed receptacle with 1 nut (without 2nd front nut), Key(A) for Printed Circuit; ComponentLink1Description: Manufacturer URL; ComponentLink1URL: http://www.lemo.com; ComponentLink2Description: Datasheet; ComponentLink2URL: http://intra.lemo.ch/catalog/ROW/UK_English/P_series_catalog.pdf
footprint PKA.M0.7NL.NZ (Socket, Female, Height 25 mm, Through hole)
pins: 1, 2, 3, 4, 5, 6, 7

## PKA.M0.7SL.NZ
designator J?
Fixed receptacle with 1 nut (without 2nd front nut), Key (A), P series, Multipole Type with 7 Contacts; Manufacturer: LEMO; PartNumber: PKA.M0.7SL.NZ; Number of contacts: 7; Contact Diameter: 0.7 mm; Test voltage (kV rms) Contact-Contact: 1.05; Rated Current(A): 5; DatasheetVersion: Jun-14; PackageReference: PKA.M0.7SL.NZ; PackageDescription: Fixed receptacle with 1 nut (without 2nd front nut), Key(A) for Printed Circuit; Supplier 1: Mouser; Supplier Part Number 1: 736-PKAM07SLNZ; Supplier 2: Digi-Key; Supplier Part Number 2: PKA.M0.7SL.NZ-ND; ComponentLink1Description: Manufacturer URL; ComponentLink1URL: http://www.lemo.com; ComponentLink2Description: Datasheet; ComponentLink2URL: http://intra.lemo.ch/catalog/ROW/UK_English/P_series_catalog.pdf
footprint PKA.M0.7SL.NZ (Socket, Female, Height 25 mm, Through hole)
pins: 1, 2, 3, 4, 5, 6, 7

## PKA.M0.7SL.VA
designator J?
Fixed receptacle with two nuts (back panel mounting), 90° print contacts, Key (A),  series, Multipole Type with 7 Contacts; Manufacturer: LEMO; PartNumber: PKA.M0.7SL.VA; Number of contacts: 7; Contact Diameter: 0.7 mm; Test voltage (kV rms) Contact-Contact: 1.05; Rated Current(A): 5; DatasheetVersion: Jun-14; PackageReference: PKA.M0.7SL.VA; PackageDescription: Fixed receptacle with two nuts (back panel mounting), 90° print contacts, Key(A) for Printed Circuit; Supplier 1: Mouser; Supplier Part Number 1: 736-PKAM07SLVA; Supplier 2: Digi-Key; Supplier Part Number 2: PKA.M0.7SL.VA-ND; ComponentLink1Description: Manufacturer URL; ComponentLink1URL: http://www.lemo.com; ComponentLink2Description: Datasheet; ComponentLink2URL: http://intra.lemo.ch/catalog/ROW/UK_English/P_series_catalog.pdf
footprint PKA.M0.7SL.VA (Socket, Female, Height 33.5 mm, Through hole)
pins: 1, 2, 3, 4, 5, 6, 7

## PKA.M0.7SL.VV
designator J?
Fixed receptacle with two nuts (back panel mounting), 90° print contacts, Key (A), P series, Multipole Type with 7 Contacts; Manufacturer: LEMO; PartNumber: PKA.M0.7SL.VV; Number of contacts: 7; Contact Diameter: 0.7 mm; Test voltage (kV rms) Contact-Contact: 1.05; Rated Current(A): 5; DatasheetVersion: Jun-14; PackageReference: PKA.M0.7SL.VV; PackageDescription: Fixed receptacle with two nuts (back panel mounting), 90° print contacts, Key(A) for Printed Circuit; ComponentLink1Description: Manufacturer URL; ComponentLink1URL: http://www.lemo.com; ComponentLink2Description: Datasheet; ComponentLink2URL: http://intra.lemo.ch/catalog/ROW/UK_English/P_series_catalog.pdf
footprint PKA.M0.7SL.VV (Socket, Female, Height 33.5 mm, Through hole)
pins: 1, 2, 3, 4, 5, 6, 7

## PKA.M0.7SL.VZ
designator J?
Fixed receptacle with 1 nut (without 2nd front nut), Key (A), P series, Multipole Type with 7 Contacts; Manufacturer: LEMO; PartNumber: PKA.M0.7SL.VZ; Number of contacts: 7; Contact Diameter: 0.7 mm; Test voltage (kV rms) Contact-Contact: 1.05; Rated Current(A): 5; DatasheetVersion: Jun-14; PackageReference: PKA.M0.7SL.VZ; PackageDescription: Fixed receptacle with 1 nut (without 2nd front nut), Key(A) for Printed Circuit; Supplier 1: Mouser; Supplier Part Number 1: 736-PKAM07SLVZ; Supplier 2: Digi-Key; Supplier Part Number 2: PKA.M0.7SL.VZ-ND; ComponentLink1Description: Manufacturer URL; ComponentLink1URL: http://www.lemo.com; ComponentLink2Description: Datasheet; ComponentLink2URL: http://intra.lemo.ch/catalog/ROW/UK_English/P_series_catalog.pdf
footprint PKA.M0.7SL.VZ (Socket, Female, Height 33.5 mm, Through hole)
pins: 1, 2, 3, 4, 5, 6, 7
